# Altium footprint library KwantLib.PcbLib: 249 footprints (part 7 of 16)
Each footprint in its own frame and in the unit in brackets; x right, y up, seen from the top. Pads: shape width x height; smd on the part's side, far side on the other; paste and mask are expansions set on the pad; w line width, h text height; cw(c..) or ccw(c..) is an arc to the next point about the centre after c.
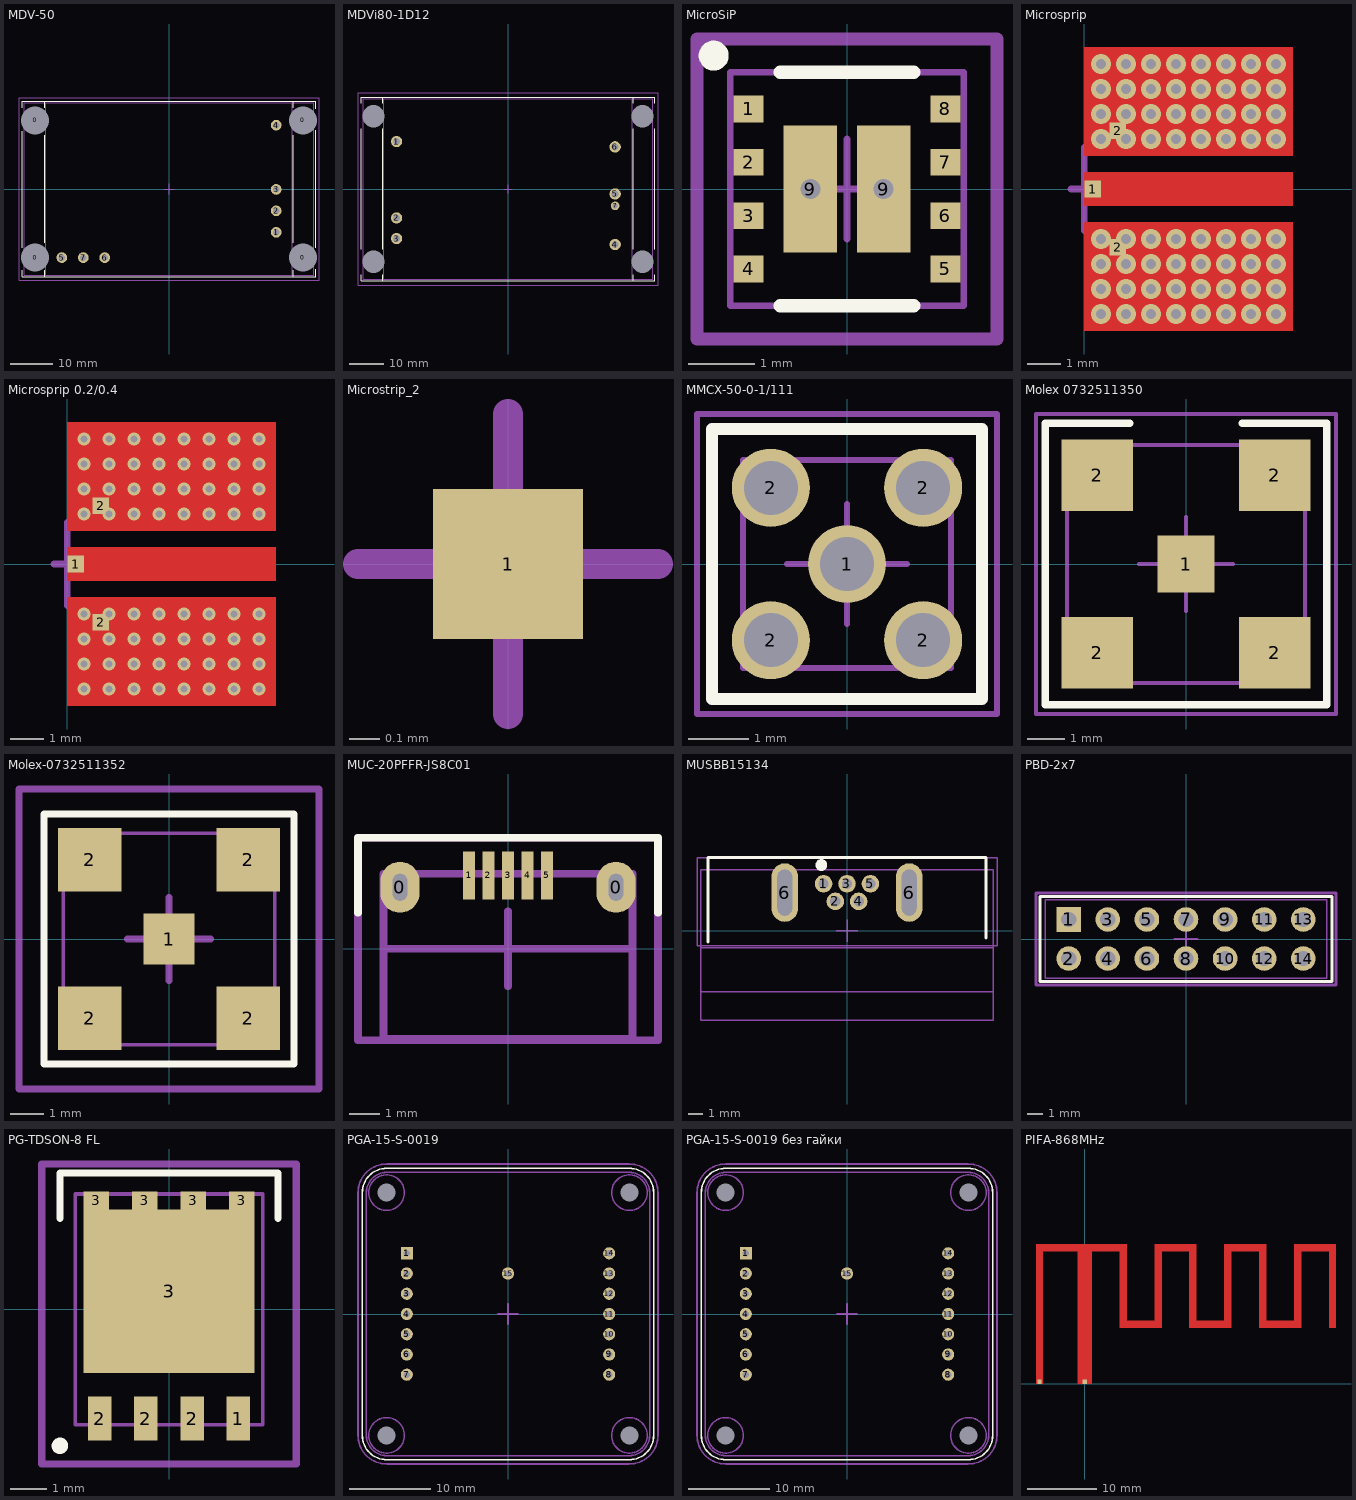
[diagram p6: the footprints below, top view; thin cyan lines are the x and y axes]

## MDV-50 [mm] "АЕДОН MDV50"
height 10.15
pads (11):
  round 1.8 hole 6.5 unplated: 0(-31.25,-16) 0(-31.25,16) 0(31.25,-16) 0(31.25,16)
  round 2.5 hole 1.5: 1(25,-10.1) 2(25,-5.1) 3(25,-0.1) 4(25,14.9) 5(-25,-16) 6(-15,-16) 7(-20,-16)
Top Overlay:
  lines w0.2: -34.25,-19 -34.25,-20.5 34.25,-20.5 34.25,-18.75 ; -34.25,-13.75 -34.25,13.5 ; -34.25,19 -34.25,20.5 34.25,20.5 34.25,18.75 ; -29,-20.5 -29,-19 ; -29,-12.5 -29,12.5 ; -29,19 -29,20.5 ; 29,-20.5 29,-19 ; 29,-12.5 29,12.5 ; 29,19 29,20.5 ; 34.25,-13.75 34.25,13.75
Mechanical 13:
  circle w0.2: c31.25,16 r1.35
  circle w0.2: c31.25,-16 r1.35
  circle w0.2: c-31.25,-16 r1.35
  circle w0.2: c-31.25,16 r1.35
  lines w0.1: -33,-16 -29.5,-16 ; -33,16 -29.5,16 ; -31.25,-17.75 -31.25,-14.25 ; -31.25,14.25 -31.25,17.75 ; 29.5,-16 33,-16 ; 29.5,16 33,16 ; 31.25,-17.75 31.25,-14.25 ; 31.25,14.25 31.25,17.75
  lines w0.2: -28.75,-20.1 -28.75,20.1 ; 28.75,-20.1 28.75,20.1 ; -33.75,-20.1 33.75,-20.1 33.75,20.1 -33.75,20.1 -33.75,-20.1
Mechanical 15:
  lines w0.1: -1.25,0 1.25,0 ; 0,-1.25 0,1.25
  lines w0.2: -35,-21.25 35,-21.25 35,21.25 -35,21.25 -35,-21.25
3D body "MDV50_.stp": height 10.15, standoff -6, extent -33.75,-20.1 33.75,20.1

## MDVi80-1D12 [mm] "АЕДОН источник питания"
height 12.85
pads (11):
  round 1.8 hole 6.5 unplated: 0(-39.25,-21.25) 0(-39.25,21.25) 0(39.25,-21.25) 0(39.25,21.25)
  round 3.3 hole 2: 1(-32.5,13.85) 2(-32.5,-8.45) 3(-32.5,-14.45) 4(31.25,-16.2) 5(31.25,-1.45) 6(31.25,12.3)
  round 2.5 hole 1.5: 7(31.25,-4.9)
Top Overlay:
  lines w0.2: -42.75,-25 -42.75,-26.75 42.75,-26.75 42.75,-25 ; -42.75,-17.5 -42.75,17.5 ; -42.75,25 -42.75,26.75 42.75,26.75 42.75,25 ; -36.5,-26.75 -36.5,-25 ; -36.5,-17.5 -36.5,17.5 ; -36.5,25 -36.5,26.75 ; 36.5,-26.75 36.5,-25 ; 36.5,-17.5 36.5,17.5 ; 36.5,25 36.5,26.75 ; 42.75,-17.5 42.75,17.5
Mechanical 13:
  circle w0.2: c-39.25,-21.25 r1.6
  circle w0.2: c-39.25,21.25 r1.6
  circle w0.2: c39.25,21.25 r1.6
  circle w0.2: c39.25,-21.25 r1.6
  lines w0.1: -41.25,-21.25 -37.25,-21.25 ; -41.25,21.25 -37.25,21.25 ; -39.25,-23.25 -39.25,-19.25 ; -39.25,19.25 -39.25,23.25 ; 37.25,-21.25 41.25,-21.25 ; 37.25,21.25 41.25,21.25 ; 39.25,-23.25 39.25,-19.25 ; 39.25,19.25 39.25,23.25
  lines w0.2: -36.25,-26.35 -36.25,26.35 ; 36.25,-26.35 36.25,26.35 ; -42.25,-26.35 -42.25,26.35 42.25,26.35 42.25,-26.35 -42.25,-26.35
Mechanical 15:
  lines w0.1: -1.25,0 1.25,0 ; 0,-1.25 0,1.25
  lines w0.2: -43.75,-28 -43.75,28 43.75,28 43.75,-28 -43.75,-28
3D body "MDVi80-1D12.stp": height 12.85, standoff -6, extent -42.25,-26.35 42.25,26.35

## MicroSiP [mm]
height 1.75
pads (10):
  rect 0.45x0.4 smd paste-1 mask+0.075: 1(-1.475,1.2) 2(-1.475,0.4) 3(-1.475,-0.4) 4(-1.475,-1.2) 5(1.475,-1.2) 6(1.475,-0.4) 7(1.475,0.4) 8(1.475,1.2)
  rect 0.8x1.9 smd paste-1 mask+0.075: 9(-0.55,0) 9(0.55,0)
via 0.55,0 diameter 0.6 hole 0.3
via -0.55,0 diameter 0.6 hole 0.3
Top Overlay:
  circle w0.25: c-2,2 r0.1
  lines w0.2: -1,-1.75 1,-1.75 ; -1,1.75 1,1.75
Top Paste:
  region: -1.65,1.05 -1.65,1.35 -1.3,1.35 -1.3,1.05
  region: -1.65,0.25 -1.65,0.55 -1.3,0.55 -1.3,0.25
  region: -1.65,-0.55 -1.65,-0.25 -1.3,-0.25 -1.3,-0.55
  region: -1.65,-1.35 -1.65,-1.05 -1.3,-1.05 -1.3,-1.35
  region: 1.3,-1.35 1.3,-1.05 1.65,-1.05 1.65,-1.35
  region: 1.3,-0.55 1.3,-0.25 1.65,-0.25 1.65,-0.55
  region: 1.3,0.25 1.3,0.55 1.65,0.55 1.65,0.25
  region: 1.3,1.05 1.3,1.35 1.65,1.35 1.65,1.05
  region: -0.9,-0.9 -0.9,0.9 -0.2,0.9 -0.2,-0.9
  region: 0.2,-0.9 0.2,0.9 0.9,0.9 0.9,-0.9
  lines w0.05: -1.65,-1.35 -1.65,-1.05 -1.3,-1.05 -1.3,-1.35 -1.65,-1.35 ; -1.65,-0.55 -1.65,-0.25 -1.3,-0.25 -1.3,-0.55 -1.65,-0.55 ; -1.65,0.25 -1.65,0.55 -1.3,0.55 -1.3,0.25 -1.65,0.25 ; -1.65,1.05 -1.3,1.05 -1.3,1.35 -1.65,1.35 -1.65,1.05 ; -0.9,-0.9 -0.2,-0.9 -0.2,0.9 -0.9,0.9 -0.9,-0.9 ; 0.2,-0.9 0.2,0.9 0.9,0.9 0.9,-0.9 0.2,-0.9 ; 1.3,-1.35 1.3,-1.05 1.65,-1.05 1.65,-1.35 1.3,-1.35 ; 1.3,-0.55 1.3,-0.25 1.65,-0.25 1.65,-0.55 1.3,-0.55 ; 1.3,0.25 1.3,0.55 1.65,0.55 1.65,0.25 1.3,0.25 ; 1.3,1.05 1.3,1.35 1.65,1.35 1.65,1.05 1.3,1.05
Mechanical 13:
  lines w0.1: -1.75,-1.75 -1.75,1.75 1.75,1.75 1.75,-1.75 -1.75,-1.75
Mechanical 15:
  lines w0.1: -0.75,0 0.75,0 ; 0,-0.75 0,0.75
  lines w0.2: -2.25,-2.25 2.25,-2.25 2.25,2.25 -2.25,2.25 -2.25,-2.25
3D body: height 1.75, standoff 0.01, extent -1.75,-1.75 1.75,1.75

## Microsprip [mm]
height 0.1
pads (3):
  rect 0.5x0.5 smd paste-1: 1(0.25,0) 2(1,-1.75) 2(1,1.75)
via 5.75,2.25 diameter 0.6 hole 0.3
via 5,2.25 diameter 0.6 hole 0.3
via 4.25,2.25 diameter 0.6 hole 0.3
via 5.75,1.5 diameter 0.6 hole 0.3
via 5,1.5 diameter 0.6 hole 0.3
via 4.25,1.5 diameter 0.6 hole 0.3
via 5.75,-2.25 diameter 0.6 hole 0.3
via 5,-2.25 diameter 0.6 hole 0.3
via 4.25,-2.25 diameter 0.6 hole 0.3
via 5.75,-1.5 diameter 0.6 hole 0.3
via 5,-1.5 diameter 0.6 hole 0.3
via 4.25,-1.5 diameter 0.6 hole 0.3
via 3.5,2.25 diameter 0.6 hole 0.3
via 2.75,2.25 diameter 0.6 hole 0.3
via 2,2.25 diameter 0.6 hole 0.3
via 1.25,2.25 diameter 0.6 hole 0.3
via 0.5,2.25 diameter 0.6 hole 0.3
via 3.5,-2.25 diameter 0.6 hole 0.3
via 2.75,-2.25 diameter 0.6 hole 0.3
via 2,-2.25 diameter 0.6 hole 0.3
via 1.25,-2.25 diameter 0.6 hole 0.3
via 0.5,-2.25 diameter 0.6 hole 0.3
via 3.5,-1.5 diameter 0.6 hole 0.3
via 2.75,-1.5 diameter 0.6 hole 0.3
via 2,-1.5 diameter 0.6 hole 0.3
via 1.25,-1.5 diameter 0.6 hole 0.3
via 0.5,-1.5 diameter 0.6 hole 0.3
via 0.5,1.5 diameter 0.6 hole 0.3
via 1.25,1.5 diameter 0.6 hole 0.3
via 2,1.5 diameter 0.6 hole 0.3
via 2.75,1.5 diameter 0.6 hole 0.3
via 3.5,1.5 diameter 0.6 hole 0.3
via 0.5,-3 diameter 0.6 hole 0.3
via 1.25,-3 diameter 0.6 hole 0.3
via 2,-3 diameter 0.6 hole 0.3
via 2.75,-3 diameter 0.6 hole 0.3
via 3.5,-3 diameter 0.6 hole 0.3
via 4.25,-3 diameter 0.6 hole 0.3
via 5,-3 diameter 0.6 hole 0.3
via 5.75,-3 diameter 0.6 hole 0.3
via 0.5,-3.75 diameter 0.6 hole 0.3
via 1.25,-3.75 diameter 0.6 hole 0.3
via 2,-3.75 diameter 0.6 hole 0.3
via 2.75,-3.75 diameter 0.6 hole 0.3
via 3.5,-3.75 diameter 0.6 hole 0.3
via 4.25,-3.75 diameter 0.6 hole 0.3
via 5,-3.75 diameter 0.6 hole 0.3
via 5.75,-3.75 diameter 0.6 hole 0.3
via 5.75,3 diameter 0.6 hole 0.3
via 5,3 diameter 0.6 hole 0.3
via 4.25,3 diameter 0.6 hole 0.3
via 3.5,3 diameter 0.6 hole 0.3
via 2.75,3 diameter 0.6 hole 0.3
via 2,3 diameter 0.6 hole 0.3
via 1.25,3 diameter 0.6 hole 0.3
via 0.5,3 diameter 0.6 hole 0.3
via 5.75,3.75 diameter 0.6 hole 0.3
via 5,3.75 diameter 0.6 hole 0.3
via 4.25,3.75 diameter 0.6 hole 0.3
via 3.5,3.75 diameter 0.6 hole 0.3
via 2.75,3.75 diameter 0.6 hole 0.3
via 2,3.75 diameter 0.6 hole 0.3
via 1.25,3.75 diameter 0.6 hole 0.3
via 0.5,3.75 diameter 0.6 hole 0.3
Top Layer:
  region: 0,0.5 0,-0.5 6.25,-0.5 6.25,0.5
  region: 0,-1 6.25,-1 6.25,-4.25 0,-4.25
  region: 0,4.25 6.25,4.25 6.25,1 0,1
Top Solder:
  rectangle: -0.25,-4.5 6.5,4.5
Mechanical 15:
  lines w0.2: -0.4,0 1.25,0 ; 0,-1.25 0,1.25

## Microsprip 0.2/0.4 [mm]
height 0.1
pads (3):
  rect 0.5x0.5 smd paste-1: 1(0.25,0) 2(1,-1.75) 2(1,1.75)
via 5.75,2.25 diameter 0.4 hole 0.2
via 5,2.25 diameter 0.4 hole 0.2
via 4.25,2.25 diameter 0.4 hole 0.2
via 5.75,1.5 diameter 0.4 hole 0.2
via 5,1.5 diameter 0.4 hole 0.2
via 4.25,1.5 diameter 0.4 hole 0.2
via 5.75,-2.25 diameter 0.4 hole 0.2
via 5,-2.25 diameter 0.4 hole 0.2
via 4.25,-2.25 diameter 0.4 hole 0.2
via 5.75,-1.5 diameter 0.4 hole 0.2
via 5,-1.5 diameter 0.4 hole 0.2
via 4.25,-1.5 diameter 0.4 hole 0.2
via 3.5,2.25 diameter 0.4 hole 0.2
via 2.75,2.25 diameter 0.4 hole 0.2
via 2,2.25 diameter 0.4 hole 0.2
via 1.25,2.25 diameter 0.4 hole 0.2
via 0.5,2.25 diameter 0.4 hole 0.2
via 3.5,-2.25 diameter 0.4 hole 0.2
via 2.75,-2.25 diameter 0.4 hole 0.2
via 2,-2.25 diameter 0.4 hole 0.2
via 1.25,-2.25 diameter 0.4 hole 0.2
via 0.5,-2.25 diameter 0.4 hole 0.2
via 3.5,-1.5 diameter 0.4 hole 0.2
via 2.75,-1.5 diameter 0.4 hole 0.2
via 2,-1.5 diameter 0.4 hole 0.2
via 1.25,-1.5 diameter 0.4 hole 0.2
via 0.5,-1.5 diameter 0.4 hole 0.2
via 0.5,1.5 diameter 0.4 hole 0.2
via 1.25,1.5 diameter 0.4 hole 0.2
via 2,1.5 diameter 0.4 hole 0.2
via 2.75,1.5 diameter 0.4 hole 0.2
via 3.5,1.5 diameter 0.4 hole 0.2
via 0.5,-3 diameter 0.4 hole 0.2
via 1.25,-3 diameter 0.4 hole 0.2
via 2,-3 diameter 0.4 hole 0.2
via 2.75,-3 diameter 0.4 hole 0.2
via 3.5,-3 diameter 0.4 hole 0.2
via 4.25,-3 diameter 0.4 hole 0.2
via 5,-3 diameter 0.4 hole 0.2
via 5.75,-3 diameter 0.4 hole 0.2
via 0.5,-3.75 diameter 0.4 hole 0.2
via 1.25,-3.75 diameter 0.4 hole 0.2
via 2,-3.75 diameter 0.4 hole 0.2
via 2.75,-3.75 diameter 0.4 hole 0.2
via 3.5,-3.75 diameter 0.4 hole 0.2
via 4.25,-3.75 diameter 0.4 hole 0.2
via 5,-3.75 diameter 0.4 hole 0.2
via 5.75,-3.75 diameter 0.4 hole 0.2
via 5.75,3 diameter 0.4 hole 0.2
via 5,3 diameter 0.4 hole 0.2
via 4.25,3 diameter 0.4 hole 0.2
via 3.5,3 diameter 0.4 hole 0.2
via 2.75,3 diameter 0.4 hole 0.2
via 2,3 diameter 0.4 hole 0.2
via 1.25,3 diameter 0.4 hole 0.2
via 0.5,3 diameter 0.4 hole 0.2
via 5.75,3.75 diameter 0.4 hole 0.2
via 5,3.75 diameter 0.4 hole 0.2
via 4.25,3.75 diameter 0.4 hole 0.2
via 3.5,3.75 diameter 0.4 hole 0.2
via 2.75,3.75 diameter 0.4 hole 0.2
via 2,3.75 diameter 0.4 hole 0.2
via 1.25,3.75 diameter 0.4 hole 0.2
via 0.5,3.75 diameter 0.4 hole 0.2
Top Layer:
  region: 0,0.5 0,-0.5 6.25,-0.5 6.25,0.5
  region: 0,-1 6.25,-1 6.25,-4.25 0,-4.25
  region: 0,4.25 6.25,4.25 6.25,1 0,1
Top Solder:
  rectangle: -0.25,-4.5 6.5,4.5
Mechanical 15:
  lines w0.2: -0.4,0 1.25,0 ; 0,-1.25 0,1.25

## Microstrip_2 [mm] "Просто точка на плате"
pads (1):
  rect 0.5x0.5 smd: 1(0,0)
Mechanical 15:
  lines w0.1: -0.5,0 0.5,0 ; 0,-0.5 0,0.5

## MMCX-50-0-1/111 [mm] "Huber Suhner MMCX female, Vertical"
height 4.5
pads (5):
  round 1.3 hole 0.9: 1(0,0) 2(-1.27,-1.27) 2(-1.27,1.27) 2(1.27,-1.27) 2(1.27,1.27)
Top Overlay:
  lines w0.2: -2.25,-2.25 2.25,-2.25 2.25,2.25 -2.25,2.25 -2.25,-2.25
Mechanical 13:
  lines w0.1: -1.73,-1.73 1.73,-1.73 1.73,1.73 -1.73,1.73 -1.73,-1.73
Mechanical 15:
  lines w0.1: -1,0 1,0 ; 0,-1 0,1 ; -2.5,-2.5 -2.5,2.5 2.5,2.5 2.5,-2.5 -2.5,-2.5
3D body "MMCX-50-0-1_111.stp": height 4.5, standoff -3, extent -1.73,-1.73 1.73,1.73

## Molex 0732511350 [mm] "SMA SMD connector"
height 9.6
pads (5):
  rect 1.52x1.52 smd mask+0.07: 1(0,0)
  rect 1.905x1.905 smd mask+0.07: 2(-2.37,-2.37) 2(-2.37,2.37) 2(2.37,-2.37) 2(2.37,2.37)
Top Overlay:
  lines w0.2: -1.5,3.75 -3.75,3.75 -3.75,-3.75 3.75,-3.75 3.75,3.75 1.5,3.75
Mechanical 13:
  lines w0.1: -3.175,-3.175 3.175,-3.175 3.175,3.175 -3.175,3.175 -3.175,-3.175
Mechanical 15:
  lines w0.1: -1.25,0 1.25,0 ; 0,-1.25 0,1.25 ; -4,-4 4,-4 4,4 -4,4 -4,-4
3D body "Molex 0732511350.stp": height 9.53, standoff 0, extent -3.175,-3.175 3.175,3.175

## Molex-0732511352 [mm] "SMA Female"
height 9.53
pads (5):
  rect 1.52x1.52 smd mask+0.07: 1(0,0)
  rect 1.91x1.91 smd mask+0.07: 2(-2.375,-2.375) 2(-2.375,2.375) 2(2.375,-2.375) 2(2.375,2.375)
Top Overlay:
  lines w0.2: -3.75,-3.75 -3.75,3.75 3.75,3.75 3.75,-3.75 -3.75,-3.75
Mechanical 13:
  lines w0.1: -3.175,-3.175 3.175,-3.175 3.175,3.175 -3.175,3.175 -3.175,-3.175
Mechanical 15:
  lines w0.2: -1.25,0 1.25,0 ; 0,-1.25 0,1.25 ; -4.5,-4.5 -4.5,4.5 4.5,4.5 4.5,-4.5 -4.5,-4.5
3D body "Molex-0732511352.stp": height 9.54, standoff 0.01, extent -3.175,-3.175 3.175,3.175

## MUC-20PFFR-JS8C01 [mm]
pads (7):
  oval 1.3x1.7 hole 0.5 slot 0.9 at 90 deg: 0(-3.6,2.05) 0(3.6,2.05)
  rect 0.4x1.6 smd: 1(-1.3,2.45) 2(-0.65,2.45) 3(0,2.45) 4(0.65,2.45) 5(1.3,2.45)
Top Overlay:
  lines w0.254: -5,1.2 -5,3.7 5,3.7 5,1.2
Mechanical 13:
  lines w0.254: -4.15,0 4.15,0 ; -4.15,-3 4.15,-3 4.15,2.5 -4.15,2.5 -4.15,-3
Mechanical 15:
  lines w0.254: -1.25,0 1.25,0 ; 0,-1.25 0,1.25 ; -5,-3.05 -5,3.7 5,3.7 5,-3.05 -5,-3.05
3D body "MUC-20PFFR-JS8C01.stp": height 3.55, standoff -1.28, extent -4.15,-3 4.15,2.52

## MUSBB15134 [mm]
pads (7):
  round 1.2 hole 0.7 mask+0.07: 1(-1.6,3.22) 2(-0.8,2.02) 3(0,3.22) 4(0.8,2.02) 5(1.6,3.22)
  oval 1.8x4 hole 1 slot 3.15 at 90 deg mask+0.07: 6(-4.25,2.62) 6(4.25,2.62)
Top Overlay:
  circle w0.4: c-1.75,4.5 r0.2
  lines w0.2: -9.5,-0.75 -9.5,5 0,5 9.5,5 9.5,-0.5
Mechanical 13:
  lines w0.1: -10,-4.17 10,-4.17 ; -10,-1.16 10,-1.16 ; -10,-6.11 10,-6.11 10,4.17 -10,4.17 -10,-6.11
Mechanical 15:
  lines w0.1: -0.75,0 0.75,0 ; 0,-0.75 0,0.75 ; -10.25,-1 -10.25,5 10.25,5 10.25,-1 -10.25,-1
3D body "M-MUSB-B151-34-REVG2-norm.stp": height 8.5, standoff -2.5, extent -10,-6.11 10,4.17

## PBD-2x7 [mm]
height 8.5
pads (14):
  rect 1.6x1.6 hole 1: 1(-7.62,1.27)
  round 1.6 hole 1: 2(-7.62,-1.27) 3(-5.08,1.27) 4(-5.08,-1.27) 5(-2.54,1.27) 6(-2.54,-1.27) 7(0,1.27) 8(0,-1.27) 9(2.54,1.27) 10(2.54,-1.27) 11(5.08,1.27) 12(5.08,-1.27) 13(7.62,1.27) 14(7.62,-1.27)
Top Overlay:
  lines w0.2: -9.5,-2.75 -9.5,2.75 9.5,2.75 9.5,-2.75 -9.5,-2.75
Mechanical 13:
  lines w0.1: -9.14,-2.54 -9.14,2.54 9.14,2.54 9.14,-2.54 -9.14,-2.54
Mechanical 15:
  lines w0.1: -0.75,0 0.75,0 ; 0,-0.75 0,0.75
  lines w0.2: -9.75,-3 -9.75,3 9.75,3 9.75,-3 -9.75,-3
3D body "PBD-2x7.stp": height 8.5, standoff -2.7, extent -9.14,-2.54 9.14,2.54

## PG-TDSON-8 FL [mm] "Infenion power MOSFET"
height 1
pads (9):
  rect 0.65x1.2 smd paste-1: 1(1.905,-3) 2(-1.905,-3) 2(-0.635,-3) 2(0.635,-3)
  rect 0.7x0.5 smd paste-1: 3(-2,3) 3(-0.665,3) 3(0.665,3) 3(2,3)
  rect 4.7x4.5 smd paste-3: 3(0,0.5)
Top Overlay:
  circle w0.25: c-3,-3.75 r0.1
  lines w0.2: -3,2.5 -3,3.75 3,3.75 3,2.5
Top Paste:
  region: -2.105,-3.475 -1.705,-3.475 -1.705,-2.525 -2.105,-2.525
  region: -0.835,-3.475 -0.435,-3.475 -0.435,-2.525 -0.835,-2.525
  region: 0.435,-3.475 0.835,-3.475 0.835,-2.525 0.435,-2.525
  region: 1.705,-3.475 2.105,-3.475 2.105,-2.525 1.705,-2.525
  region: -2.225,2.4 -2.225,3.125 -1.775,3.125 -1.775,2.4
  region: -0.89,2.4 -0.89,3.125 -0.44,3.125 -0.44,2.4
  region: 0.44,2.4 0.44,3.125 0.89,3.125 0.89,2.4
  region: 1.775,2.4 1.775,3.125 2.225,3.125 2.225,2.4
  region: -1.75,0.5 -1.75,2.1 -0.15,2.1 -0.15,0.5
  region: 0.15,0.5 0.15,2.1 1.75,2.1 1.75,0.5
  region: 0.15,-1.4 1.75,-1.4 1.75,0.2 0.15,0.2
  region: -1.75,-1.4 -0.15,-1.4 -0.15,0.2 -1.75,0.2
  lines w0.1: -2.225,2.4 -1.775,2.4 -1.775,3.125 -2.225,3.125 -2.225,2.4 ; -2.105,-3.475 -2.105,-2.525 -1.705,-2.525 -1.705,-3.475 -2.105,-3.475 ; -1.75,-1.4 -1.75,0.2 -0.15,0.2 -0.15,-1.4 -1.75,-1.4 ; -1.75,0.5 -1.75,2.1 -0.15,2.1 -0.15,0.5 -1.75,0.5 ; -0.89,2.4 -0.44,2.4 -0.44,3.125 -0.89,3.125 -0.89,2.4 ; -0.835,-3.475 -0.835,-2.525 -0.435,-2.525 -0.435,-3.475 -0.835,-3.475 ; 0.15,-1.4 1.75,-1.4 1.75,0.2 0.15,0.2 0.15,-1.4 ; 0.15,0.5 0.15,2.1 1.75,2.1 1.75,0.5 0.15,0.5 ; 0.435,-3.475 0.435,-2.525 0.835,-2.525 0.835,-3.475 0.435,-3.475 ; 0.44,2.4 0.89,2.4 0.89,3.125 0.44,3.125 0.44,2.4 ; 1.705,-3.475 2.105,-3.475 2.105,-2.525 1.705,-2.525 1.705,-3.475 ; 1.775,2.4 1.775,3.125 2.225,3.125 2.225,2.4 1.775,2.4
Mechanical 13:
  lines w0.1: -2.575,-3.175 -2.575,3.175 2.575,3.175 2.575,-3.175 -2.575,-3.175
Mechanical 15:
  lines w0.2: -1,0 1,0 ; 0,-1 0,1 ; -3.5,-4.25 -3.5,4 3.5,4 3.5,-4.25 -3.5,-4.25
3D body "User Library-TDSON-8.STEP": height 1.1, standoff -0.01, extent -2.575,-3.175 2.575,3.175

## PGA-15-S-0019 [mm] "Контактирующее устройство Микросборки"
height 10.4
pads (19):
  rect 1.5x1.5 hole 0.8: 1(-12.5,7.5)
  round 1.5 hole 0.8: 2(-12.5,5) 3(-12.5,2.5) 4(-12.5,0) 5(-12.5,-2.5) 6(-12.5,-5) 7(-12.5,-7.5) 8(12.5,-7.5) 9(12.5,-5) 10(12.5,-2.5) 11(12.5,0) 12(12.5,2.5) 13(12.5,5) 14(12.5,7.5) 15(0,5)
  round 1.5 hole 2.2 unplated: MH0(-15,-15) MH0(-15,15) MH0(15,-15) MH0(15,15)
Top Overlay:
  lines w0.2: -18,-15 ccw(c-15,-15) -15,-18 15,-18 ccw(c15,-15) 18,-15 18,15 ccw(c15,15) 15,18 -15,18 ccw(c-15,15) -18,15 -18,-15
Mechanical 13:
  circle w0.2: c-15,-15 r2.2
  circle w0.2: c-15,15 r2.2
  circle w0.2: c15,-15 r2.2
  circle w0.2: c15,15 r2.2
  lines w0.2: -17.5,-15 ccw(c-15,-15) -15,-17.5 15,-17.5 ccw(c15,-15) 17.5,-15 17.5,15 ccw(c15,15) 15,17.5 -15,17.5 ccw(c-15,15) -17.5,15 -17.5,-15
Mechanical 15:
  lines w0.2: -1.25,0 1.25,0 ; 0,-1.25 0,1.25 ; -18.535,-15 ccw(c-15,-15) -15,-18.535 15,-18.535 ccw(c15,-15) 18.535,-15 18.535,15 ccw(c15,15) 15,18.535 -15,18.535 ccw(c-15,15) -18.535,15 -18.535,-15
3D body "КУ PGA-15-S-0019.stp": height 10.4, standoff -5.6, extent -17.5,-17.5 17.5,17.5

## PGA-15-S-0019 без гайки [mm] "Контактирующее устройство без гайки Микросборки"
height 8.9
pads (19):
  rect 1.5x1.5 hole 0.8: 1(-12.5,7.5)
  round 1.5 hole 0.8: 2(-12.5,5) 3(-12.5,2.5) 4(-12.5,0) 5(-12.5,-2.5) 6(-12.5,-5) 7(-12.5,-7.5) 8(12.5,-7.5) 9(12.5,-5) 10(12.5,-2.5) 11(12.5,0) 12(12.5,2.5) 13(12.5,5) 14(12.5,7.5) 15(0,5)
  round 1.5 hole 2.2 unplated: MH0(-15,-15) MH0(-15,15) MH0(15,-15) MH0(15,15)
Top Overlay:
  lines w0.2: -18,-15 ccw(c-15,-15) -15,-18 15,-18 ccw(c15,-15) 18,-15 18,15 ccw(c15,15) 15,18 -15,18 ccw(c-15,15) -18,15 -18,-15
Mechanical 13:
  circle w0.2: c-15,-15 r2.2
  circle w0.2: c-15,15 r2.2
  circle w0.2: c15,-15 r2.2
  circle w0.2: c15,15 r2.2
  lines w0.2: -17.5,-15 ccw(c-15,-15) -15,-17.5 15,-17.5 ccw(c15,-15) 17.5,-15 17.5,15 ccw(c15,15) 15,17.5 -15,17.5 ccw(c-15,15) -17.5,15 -17.5,-15
Mechanical 15:
  lines w0.2: -1.25,0 1.25,0 ; 0,-1.25 0,1.25 ; -18.535,-15 ccw(c-15,-15) -15,-18.535 15,-18.535 ccw(c15,-15) 18.535,-15 18.535,15 ccw(c15,15) 15,18.535 -15,18.535 ccw(c-15,15) -18.535,15 -18.535,-15
3D body "КУ PGA-15-S-0019 без гайки.stp": height 8.9, standoff -7.1, extent -17.5,-17.5 17.5,17.5

## PIFA-868MHz [mm]
pads (2):
  rect 0.6x0.6 smd paste-1: 1(0,0.3) 2(-6.5,0.3)
Top Layer:
  region: -7,0 -6,0 -6,19 -1,19 -1,0 1,0 1,19 5,19 5,8 11,8 11,19 15,19 15,8 21,8 21,19 25,19 25,8 31,8 31,19 35,19 35,8 36,8 36,20 30,20 30,9 26,9 26,20 20,20 20,9 16,9 16,20 10,20 10,9 6,9 6,20 -7,20